# Altium schematic symbol library jlcpcb_2025_04_capacitors_extended_1206.schlib: 2503 symbols (part 8 of 14) (continued)
## CC1206MRX7R9BB473
designator C?  Capacitance: 47nF  (hidden comment: *)
Capacitor, Ceramic (MLCC), 47nF, ±20%, 50V, X7R, ±20%, SMD 1206; Manufacturer: YAGEO; Manufacturer Part Number: CC1206MRX7R9BB473; Package Size: 1206; JLCPCB Basic Part: No; JLCPCB Part Number: C2174358; Supplier 1: LCSC; Category: Capacitors - MLCC; Supplier Part Number 1: C2174358; Tolerance: ±20%; Voltage Rating: 50V; Temperature Coefficient: X7R; RoHS: Yes; ComponentLink1Description: Datasheet; ComponentLink1URL: https://wmsc.lcsc.com/wmsc/upload/file/pdf/v2/lcsc/2202040700_YAGEO-CC1206MRX7R9BB473_C2174358.pdf; ComponentLink2Description: JLCPCB Part URL; ComponentLink2URL: https://jlcpcb.com/partdetail/C2174358; ComponentLink3Description: LCSC Part URL; ComponentLink3URL: https://lcsc.com/product-detail/Multilayer-Ceramic-Capacitors-MLCC---SMD-SMT_YAGEO-YAGEO-CC1206MRX7R9BB473_C2174358.html
footprint CAP-1206 (1206 (3216M) Capacitor)
pins: 1, 2

## CC1206MRY5V6BB106
designator C?  Capacitance: 10uF  (hidden comment: *)
Capacitor, Ceramic (MLCC), 10uF, ±20%, 10V, Y5V, ±20%, SMD 1206; Manufacturer: YAGEO; Manufacturer Part Number: CC1206MRY5V6BB106; Package Size: 1206; JLCPCB Basic Part: No; JLCPCB Part Number: C527365; Supplier 1: LCSC; Category: Capacitors - MLCC; Supplier Part Number 1: C527365; Tolerance: ±20%; Voltage Rating: 10V; Temperature Coefficient: Y5V; RoHS: Yes; ComponentLink1Description: Datasheet; ComponentLink1URL: https://wmsc.lcsc.com/wmsc/upload/file/pdf/v2/lcsc/2006031537_YAGEO-CC1206MRY5V6BB106_C527365.pdf; ComponentLink2Description: JLCPCB Part URL; ComponentLink2URL: https://jlcpcb.com/partdetail/C527365; ComponentLink3Description: LCSC Part URL; ComponentLink3URL: https://lcsc.com/product-detail/Multilayer-Ceramic-Capacitors-MLCC---SMD-SMT_YAGEO-YAGEO-CC1206MRY5V6BB106_C527365.html
footprint CAP-1206 (1206 (3216M) Capacitor)
pins: 1, 2

## CC1206MRY5V7BB105
designator C?  Capacitance: 1uF  (hidden comment: *)
Capacitor, Ceramic (MLCC), 1uF, ±20%, 16V, Y5V, ±20%, SMD 1206; Manufacturer: YAGEO; Manufacturer Part Number: CC1206MRY5V7BB105; Package Size: 1206; JLCPCB Basic Part: No; JLCPCB Part Number: C527366; Supplier 1: LCSC; Category: Capacitors - MLCC; Supplier Part Number 1: C527366; Tolerance: ±20%; Voltage Rating: 16V; Temperature Coefficient: Y5V; RoHS: Yes; ComponentLink1Description: Datasheet; ComponentLink1URL: https://wmsc.lcsc.com/wmsc/upload/file/pdf/v2/lcsc/2006031836_YAGEO-CC1206MRY5V7BB105_C527366.pdf; ComponentLink2Description: JLCPCB Part URL; ComponentLink2URL: https://jlcpcb.com/partdetail/C527366; ComponentLink3Description: LCSC Part URL; ComponentLink3URL: https://lcsc.com/product-detail/Multilayer-Ceramic-Capacitors-MLCC---SMD-SMT_YAGEO-YAGEO-CC1206MRY5V7BB105_C527366.html
footprint CAP-1206 (1206 (3216M) Capacitor)
pins: 1, 2

## CC1206MRY5V7BB475
designator C?  Capacitance: 4.7uF  (hidden comment: *)
Capacitor, Ceramic (MLCC), 4.7uF, ±20%, 16V, Y5V, ±20%, SMD 1206; Manufacturer: YAGEO; Manufacturer Part Number: CC1206MRY5V7BB475; Package Size: 1206; JLCPCB Basic Part: No; JLCPCB Part Number: C577250; Supplier 1: LCSC; Category: Capacitors - MLCC; Supplier Part Number 1: C577250; Tolerance: ±20%; Voltage Rating: 16V; Temperature Coefficient: Y5V; RoHS: Yes; ComponentLink1Description: Datasheet; ComponentLink1URL: https://wmsc.lcsc.com/wmsc/upload/file/pdf/v2/lcsc/2006091815_YAGEO-CC1206MRY5V7BB475_C577250.pdf; ComponentLink2Description: JLCPCB Part URL; ComponentLink2URL: https://jlcpcb.com/partdetail/C577250; ComponentLink3Description: LCSC Part URL; ComponentLink3URL: https://lcsc.com/product-detail/Multilayer-Ceramic-Capacitors-MLCC---SMD-SMT_YAGEO-YAGEO-CC1206MRY5V7BB475_C577250.html
footprint CAP-1206 (1206 (3216M) Capacitor)
pins: 1, 2

## CC1206MRY5V8BB105
designator C?  Capacitance: 1uF  (hidden comment: *)
Capacitor, Ceramic (MLCC), 1uF, ±20%, 25V, Y5V, ±20%, SMD 1206; Manufacturer: YAGEO; Manufacturer Part Number: CC1206MRY5V8BB105; Package Size: 1206; JLCPCB Basic Part: No; JLCPCB Part Number: C541522; Supplier 1: LCSC; Category: Capacitors - MLCC; Supplier Part Number 1: C541522; Tolerance: ±20%; Voltage Rating: 25V; Temperature Coefficient: Y5V; RoHS: Yes; ComponentLink1Description: Datasheet; ComponentLink1URL: https://wmsc.lcsc.com/wmsc/upload/file/pdf/v2/lcsc/2006151143_YAGEO-CC1206MRY5V8BB105_C541522.pdf; ComponentLink2Description: JLCPCB Part URL; ComponentLink2URL: https://jlcpcb.com/partdetail/C541522; ComponentLink3Description: LCSC Part URL; ComponentLink3URL: https://lcsc.com/product-detail/Multilayer-Ceramic-Capacitors-MLCC---SMD-SMT_YAGEO-YAGEO-CC1206MRY5V8BB105_C541522.html
footprint CAP-1206 (1206 (3216M) Capacitor)
pins: 1, 2

## CC1206MRY5V9BB104
designator C?  Capacitance: 100nF  (hidden comment: *)
Capacitor, Ceramic (MLCC), 100nF, ±20%, 50V, Y5V, ±20%, SMD 1206; Manufacturer: YAGEO; Manufacturer Part Number: CC1206MRY5V9BB104; Package Size: 1206; JLCPCB Basic Part: No; JLCPCB Part Number: C2174667; Supplier 1: LCSC; Category: Capacitors - MLCC; Supplier Part Number 1: C2174667; Tolerance: ±20%; Voltage Rating: 50V; Temperature Coefficient: Y5V; RoHS: Yes; ComponentLink1Description: Datasheet; ComponentLink1URL: https://wmsc.lcsc.com/wmsc/upload/file/pdf/v2/lcsc/2202040700_YAGEO-CC1206MRY5V9BB104_C2174667.pdf; ComponentLink2Description: JLCPCB Part URL; ComponentLink2URL: https://jlcpcb.com/partdetail/C2174667; ComponentLink3Description: LCSC Part URL; ComponentLink3URL: https://lcsc.com/product-detail/Multilayer-Ceramic-Capacitors-MLCC---SMD-SMT_YAGEO-YAGEO-CC1206MRY5V9BB104_C2174667.html
footprint CAP-1206 (1206 (3216M) Capacitor)
pins: 1, 2

## CC1206MRY5V9BB105
designator C?  Capacitance: 1uF  (hidden comment: *)
Capacitor, Ceramic (MLCC), 1uF, ±20%, 50V, Y5V, ±20%, SMD 1206; Manufacturer: YAGEO; Manufacturer Part Number: CC1206MRY5V9BB105; Package Size: 1206; JLCPCB Basic Part: No; JLCPCB Part Number: C527367; Supplier 1: LCSC; Category: Capacitors - MLCC; Supplier Part Number 1: C527367; Tolerance: ±20%; Voltage Rating: 50V; Temperature Coefficient: Y5V; RoHS: Yes; ComponentLink1Description: Datasheet; ComponentLink1URL: https://wmsc.lcsc.com/wmsc/upload/file/pdf/v2/lcsc/2007221234_YAGEO-CC1206MRY5V9BB105_C527367.pdf; ComponentLink2Description: JLCPCB Part URL; ComponentLink2URL: https://jlcpcb.com/partdetail/C527367; ComponentLink3Description: LCSC Part URL; ComponentLink3URL: https://lcsc.com/product-detail/Multilayer-Ceramic-Capacitors-MLCC---SMD-SMT_YAGEO-YAGEO-CC1206MRY5V9BB105_C527367.html
footprint CAP-1206 (1206 (3216M) Capacitor)
pins: 1, 2

## CC1206ZKY5V5BB226
designator C?  Capacitance: 22uF  (hidden comment: *)
Capacitor, Ceramic (MLCC), 22uF, 6.3V, Y5V, SMD 1206; Manufacturer: YAGEO; Manufacturer Part Number: CC1206ZKY5V5BB226; Temperature Rating: -20%~+80%; Package Size: 1206; JLCPCB Basic Part: No; JLCPCB Part Number: C527368; Supplier 1: LCSC; Category: Capacitors - MLCC; Supplier Part Number 1: C527368; Voltage Rating: 6.3V; Temperature Coefficient: Y5V; RoHS: Yes; ComponentLink1Description: Datasheet; ComponentLink1URL: https://wmsc.lcsc.com/wmsc/upload/file/pdf/v2/lcsc/2006241835_YAGEO-CC1206ZKY5V5BB226_C527368.pdf; ComponentLink2Description: JLCPCB Part URL; ComponentLink2URL: https://jlcpcb.com/partdetail/C527368; ComponentLink3Description: LCSC Part URL; ComponentLink3URL: https://lcsc.com/product-detail/Multilayer-Ceramic-Capacitors-MLCC---SMD-SMT_YAGEO-YAGEO-CC1206ZKY5V5BB226_C527368.html
footprint CAP-1206 (1206 (3216M) Capacitor)
pins: 1, 2

## CC1206ZKY5V7BB106
designator C?  Capacitance: 10uF  (hidden comment: *)
Capacitor, Ceramic (MLCC), 10uF, 16V, Y5V, SMD 1206; Manufacturer: YAGEO; Manufacturer Part Number: CC1206ZKY5V7BB106; Temperature Rating: -20%~+80%; Package Size: 1206; JLCPCB Basic Part: No; JLCPCB Part Number: C106237; Supplier 1: LCSC; Category: Capacitors - MLCC; Supplier Part Number 1: C106237; Voltage Rating: 16V; Temperature Coefficient: Y5V; RoHS: Yes; ComponentLink1Description: Datasheet; ComponentLink1URL: https://wmsc.lcsc.com/wmsc/upload/file/pdf/v2/lcsc/2304140030_YAGEO-CC1206ZKY5V7BB106_C106237.pdf; ComponentLink2Description: JLCPCB Part URL; ComponentLink2URL: https://jlcpcb.com/partdetail/C106237; ComponentLink3Description: LCSC Part URL; ComponentLink3URL: https://lcsc.com/product-detail/Multilayer-Ceramic-Capacitors-MLCC---SMD-SMT_YAGEO-YAGEO-CC1206ZKY5V7BB106_C106237.html
footprint CAP-1206 (1206 (3216M) Capacitor)
pins: 1, 2

## CC1206ZKY5V7BB226
designator C?  Capacitance: 22uF  (hidden comment: *)
Capacitor, Ceramic (MLCC), 22uF, 16V, Y5V, SMD 1206; Manufacturer: YAGEO; Manufacturer Part Number: CC1206ZKY5V7BB226; Temperature Rating: -20%~+80%; Package Size: 1206; JLCPCB Basic Part: No; JLCPCB Part Number: C527370; Supplier 1: LCSC; Category: Capacitors - MLCC; Supplier Part Number 1: C527370; Voltage Rating: 16V; Temperature Coefficient: Y5V; RoHS: Yes; ComponentLink1Description: Datasheet; ComponentLink1URL: https://wmsc.lcsc.com/wmsc/upload/file/pdf/v2/lcsc/2006101836_YAGEO-CC1206ZKY5V7BB226_C527370.pdf; ComponentLink2Description: JLCPCB Part URL; ComponentLink2URL: https://jlcpcb.com/partdetail/C527370; ComponentLink3Description: LCSC Part URL; ComponentLink3URL: https://lcsc.com/product-detail/Multilayer-Ceramic-Capacitors-MLCC---SMD-SMT_YAGEO-YAGEO-CC1206ZKY5V7BB226_C527370.html
footprint CAP-1206 (1206 (3216M) Capacitor)
pins: 1, 2

## CC1206ZKY5V8BB106
designator C?  Capacitance: 10uF  (hidden comment: *)
Capacitor, Ceramic (MLCC), 10uF, 25V, Y5V, SMD 1206; Manufacturer: YAGEO; Manufacturer Part Number: CC1206ZKY5V8BB106; Temperature Rating: -20%~+80%; Package Size: 1206; JLCPCB Basic Part: No; JLCPCB Part Number: C106238; Supplier 1: LCSC; Category: Capacitors - MLCC; Supplier Part Number 1: C106238; Voltage Rating: 25V; Temperature Coefficient: Y5V; RoHS: Yes; ComponentLink1Description: Datasheet; ComponentLink1URL: https://wmsc.lcsc.com/wmsc/upload/file/pdf/v2/lcsc/2304140030_YAGEO-CC1206ZKY5V8BB106_C106238.pdf; ComponentLink2Description: JLCPCB Part URL; ComponentLink2URL: https://jlcpcb.com/partdetail/C106238; ComponentLink3Description: LCSC Part URL; ComponentLink3URL: https://lcsc.com/product-detail/Multilayer-Ceramic-Capacitors-MLCC---SMD-SMT_YAGEO-YAGEO-CC1206ZKY5V8BB106_C106238.html
footprint CAP-1206 (1206 (3216M) Capacitor)
pins: 1, 2

## CC1206ZKY5V9BB225
designator C?  Capacitance: 2.2uF  (hidden comment: *)
Capacitor, Ceramic (MLCC), 2.2uF, 50V, Y5V, SMD 1206; Manufacturer: YAGEO; Manufacturer Part Number: CC1206ZKY5V9BB225; Temperature Rating: -20%~+80%; Package Size: 1206; JLCPCB Basic Part: No; JLCPCB Part Number: C577253; Supplier 1: LCSC; Category: Capacitors - MLCC; Supplier Part Number 1: C577253; Voltage Rating: 50V; Temperature Coefficient: Y5V; RoHS: Yes; ComponentLink1Description: Datasheet; ComponentLink1URL: https://wmsc.lcsc.com/wmsc/upload/file/pdf/v2/lcsc/2112221830_YAGEO-CC1206ZKY5V9BB225_C577253.pdf; ComponentLink2Description: JLCPCB Part URL; ComponentLink2URL: https://jlcpcb.com/partdetail/C577253; ComponentLink3Description: LCSC Part URL; ComponentLink3URL: https://lcsc.com/product-detail/Multilayer-Ceramic-Capacitors-MLCC---SMD-SMT_YAGEO-YAGEO-CC1206ZKY5V9BB225_C577253.html
footprint CAP-1206 (1206 (3216M) Capacitor)
pins: 1, 2

## CC1206ZRY5V6BB106
designator C?  Capacitance: 10uF  (hidden comment: *)
Capacitor, Ceramic (MLCC), 10uF, 10V, Y5V, SMD 1206; Manufacturer: YAGEO; Manufacturer Part Number: CC1206ZRY5V6BB106; Temperature Rating: -20%~+80%; Package Size: 1206; JLCPCB Basic Part: No; JLCPCB Part Number: C113914; Supplier 1: LCSC; Category: Capacitors - MLCC; Supplier Part Number 1: C113914; Voltage Rating: 10V; Temperature Coefficient: Y5V; RoHS: Yes; ComponentLink1Description: Datasheet; ComponentLink1URL: https://wmsc.lcsc.com/wmsc/upload/file/pdf/v2/lcsc/2304140030_YAGEO-CC1206ZRY5V6BB106_C113914.pdf; ComponentLink2Description: JLCPCB Part URL; ComponentLink2URL: https://jlcpcb.com/partdetail/C113914; ComponentLink3Description: LCSC Part URL; ComponentLink3URL: https://lcsc.com/product-detail/Multilayer-Ceramic-Capacitors-MLCC---SMD-SMT_YAGEO-YAGEO-CC1206ZRY5V6BB106_C113914.html
footprint CAP-1206 (1206 (3216M) Capacitor)
pins: 1, 2

## CC1206ZRY5V7BB105
designator C?  Capacitance: 1uF  (hidden comment: *)
Capacitor, Ceramic (MLCC), 1uF, 16V, Y5V, SMD 1206; Manufacturer: YAGEO; Manufacturer Part Number: CC1206ZRY5V7BB105; Temperature Rating: -20%~+80%; Package Size: 1206; JLCPCB Basic Part: No; JLCPCB Part Number: C527371; Supplier 1: LCSC; Category: Capacitors - MLCC; Supplier Part Number 1: C527371; Voltage Rating: 16V; Temperature Coefficient: Y5V; RoHS: Yes; ComponentLink1Description: Datasheet; ComponentLink1URL: https://wmsc.lcsc.com/wmsc/upload/file/pdf/v2/lcsc/2005261833_YAGEO-CC1206ZRY5V7BB105_C527371.pdf; ComponentLink2Description: JLCPCB Part URL; ComponentLink2URL: https://jlcpcb.com/partdetail/C527371; ComponentLink3Description: LCSC Part URL; ComponentLink3URL: https://lcsc.com/product-detail/Multilayer-Ceramic-Capacitors-MLCC---SMD-SMT_YAGEO-YAGEO-CC1206ZRY5V7BB105_C527371.html
footprint CAP-1206 (1206 (3216M) Capacitor)
pins: 1, 2

## CC1206ZRY5V7BB225
designator C?  Capacitance: 2.2uF  (hidden comment: *)
Capacitor, Ceramic (MLCC), 2.2uF, 16V, Y5V, SMD 1206; Manufacturer: YAGEO; Manufacturer Part Number: CC1206ZRY5V7BB225; Temperature Rating: -20%~+80%; Package Size: 1206; JLCPCB Basic Part: No; JLCPCB Part Number: C309504; Supplier 1: LCSC; Category: Capacitors - MLCC; Supplier Part Number 1: C309504; Voltage Rating: 16V; Temperature Coefficient: Y5V; RoHS: Yes; ComponentLink1Description: Datasheet; ComponentLink1URL: https://wmsc.lcsc.com/wmsc/upload/file/pdf/v2/lcsc/2311211121_YAGEO-CC1206ZRY5V7BB225_C309504.pdf; ComponentLink2Description: JLCPCB Part URL; ComponentLink2URL: https://jlcpcb.com/partdetail/C309504; ComponentLink3Description: LCSC Part URL; ComponentLink3URL: https://lcsc.com/product-detail/Multilayer-Ceramic-Capacitors-MLCC---SMD-SMT_YAGEO-YAGEO-CC1206ZRY5V7BB225_C309504.html
footprint CAP-1206 (1206 (3216M) Capacitor)
pins: 1, 2

## CC1206ZRY5V8BB105
designator C?  Capacitance: 1uF  (hidden comment: *)
Capacitor, Ceramic (MLCC), 1uF, 25V, Y5V, SMD 1206; Manufacturer: YAGEO; Manufacturer Part Number: CC1206ZRY5V8BB105; Temperature Rating: -20%~+80%; Package Size: 1206; JLCPCB Basic Part: No; JLCPCB Part Number: C527372; Supplier 1: LCSC; Category: Capacitors - MLCC; Supplier Part Number 1: C527372; Voltage Rating: 25V; Temperature Coefficient: Y5V; RoHS: Yes; ComponentLink1Description: Datasheet; ComponentLink1URL: https://wmsc.lcsc.com/wmsc/upload/file/pdf/v2/lcsc/2006101836_YAGEO-CC1206ZRY5V8BB105_C527372.pdf; ComponentLink2Description: JLCPCB Part URL; ComponentLink2URL: https://jlcpcb.com/partdetail/C527372; ComponentLink3Description: LCSC Part URL; ComponentLink3URL: https://lcsc.com/product-detail/Multilayer-Ceramic-Capacitors-MLCC---SMD-SMT_YAGEO-YAGEO-CC1206ZRY5V8BB105_C527372.html
footprint CAP-1206 (1206 (3216M) Capacitor)
pins: 1, 2

## CC1206ZRY5V8BB225
designator C?  Capacitance: 2.2uF  (hidden comment: *)
Capacitor, Ceramic (MLCC), 2.2uF, 25V, Y5V, SMD 1206; Manufacturer: YAGEO; Manufacturer Part Number: CC1206ZRY5V8BB225; Temperature Rating: -20%~+80%; Package Size: 1206; JLCPCB Basic Part: No; JLCPCB Part Number: C527373; Supplier 1: LCSC; Category: Capacitors - MLCC; Supplier Part Number 1: C527373; Voltage Rating: 25V; Temperature Coefficient: Y5V; RoHS: Yes; ComponentLink1Description: Datasheet; ComponentLink1URL: https://wmsc.lcsc.com/wmsc/upload/file/pdf/v2/lcsc/2009071505_YAGEO-CC1206ZRY5V8BB225_C527373.pdf; ComponentLink2Description: JLCPCB Part URL; ComponentLink2URL: https://jlcpcb.com/partdetail/C527373; ComponentLink3Description: LCSC Part URL; ComponentLink3URL: https://lcsc.com/product-detail/Multilayer-Ceramic-Capacitors-MLCC---SMD-SMT_YAGEO-YAGEO-CC1206ZRY5V8BB225_C527373.html
footprint CAP-1206 (1206 (3216M) Capacitor)
pins: 1, 2

## CC1206ZRY5V8BB474
designator C?  Capacitance: 470nF  (hidden comment: *)
Capacitor, Ceramic (MLCC), 470nF, 25V, Y5V, SMD 1206; Manufacturer: YAGEO; Manufacturer Part Number: CC1206ZRY5V8BB474; Temperature Rating: -20%~+80%; Package Size: 1206; JLCPCB Basic Part: No; JLCPCB Part Number: C577257; Supplier 1: LCSC; Category: Capacitors - MLCC; Supplier Part Number 1: C577257; Voltage Rating: 25V; Temperature Coefficient: Y5V; RoHS: Yes; ComponentLink1Description: Datasheet; ComponentLink1URL: https://wmsc.lcsc.com/wmsc/upload/file/pdf/v2/lcsc/2009282204_YAGEO-CC1206ZRY5V8BB474_C577257.pdf; ComponentLink2Description: JLCPCB Part URL; ComponentLink2URL: https://jlcpcb.com/partdetail/C577257; ComponentLink3Description: LCSC Part URL; ComponentLink3URL: https://lcsc.com/product-detail/Multilayer-Ceramic-Capacitors-MLCC---SMD-SMT_YAGEO-YAGEO-CC1206ZRY5V8BB474_C577257.html
footprint CAP-1206 (1206 (3216M) Capacitor)
pins: 1, 2

## CC1206ZRY5V9BB104
designator C?  Capacitance: 100nF  (hidden comment: *)
Capacitor, Ceramic (MLCC), 100nF, 50V, Y5V, SMD 1206; Manufacturer: YAGEO; Manufacturer Part Number: CC1206ZRY5V9BB104; Temperature Rating: -20%~+80%; Package Size: 1206; JLCPCB Basic Part: No; JLCPCB Part Number: C577258; Supplier 1: LCSC; Category: Capacitors - MLCC; Supplier Part Number 1: C577258; Voltage Rating: 50V; Temperature Coefficient: Y5V; RoHS: Yes; ComponentLink1Description: Datasheet; ComponentLink1URL: https://wmsc.lcsc.com/wmsc/upload/file/pdf/v2/lcsc/2006111833_YAGEO-CC1206ZRY5V9BB104_C577258.pdf; ComponentLink2Description: JLCPCB Part URL; ComponentLink2URL: https://jlcpcb.com/partdetail/C577258; ComponentLink3Description: LCSC Part URL; ComponentLink3URL: https://lcsc.com/product-detail/Multilayer-Ceramic-Capacitors-MLCC---SMD-SMT_YAGEO-YAGEO-CC1206ZRY5V9BB104_C577258.html
footprint CAP-1206 (1206 (3216M) Capacitor)
pins: 1, 2

## CC1206ZRY5V9BB105
designator C?  Capacitance: 1uF  (hidden comment: *)
Capacitor, Ceramic (MLCC), 1uF, 50V, Y5V, SMD 1206; Manufacturer: YAGEO; Manufacturer Part Number: CC1206ZRY5V9BB105; Temperature Rating: -20%~+80%; Package Size: 1206; JLCPCB Basic Part: No; JLCPCB Part Number: C326607; Supplier 1: LCSC; Category: Capacitors - MLCC; Supplier Part Number 1: C326607; Voltage Rating: 50V; Temperature Coefficient: Y5V; RoHS: Yes; ComponentLink1Description: Datasheet; ComponentLink1URL: https://wmsc.lcsc.com/wmsc/upload/file/pdf/v2/lcsc/1811061214_YAGEO-CC1206ZRY5V9BB105_C326607.pdf; ComponentLink2Description: JLCPCB Part URL; ComponentLink2URL: https://jlcpcb.com/partdetail/C326607; ComponentLink3Description: LCSC Part URL; ComponentLink3URL: https://lcsc.com/product-detail/Multilayer-Ceramic-Capacitors-MLCC---SMD-SMT_YAGEO-YAGEO-CC1206ZRY5V9BB105_C326607.html
footprint CAP-1206 (1206 (3216M) Capacitor)
pins: 1, 2

## CC1206ZRY5V9BB224
designator C?  Capacitance: 220nF  (hidden comment: *)
Capacitor, Ceramic (MLCC), 220nF, 50V, Y5V, SMD 1206; Manufacturer: YAGEO; Manufacturer Part Number: CC1206ZRY5V9BB224; Temperature Rating: -20%~+80%; Package Size: 1206; JLCPCB Basic Part: No; JLCPCB Part Number: C113916; Supplier 1: LCSC; Category: Capacitors - MLCC; Supplier Part Number 1: C113916; Voltage Rating: 50V; Temperature Coefficient: Y5V; RoHS: Yes; ComponentLink1Description: Datasheet; ComponentLink1URL: https://wmsc.lcsc.com/wmsc/upload/file/pdf/v2/lcsc/2304140030_YAGEO-CC1206ZRY5V9BB224_C113916.pdf; ComponentLink2Description: JLCPCB Part URL; ComponentLink2URL: https://jlcpcb.com/partdetail/C113916; ComponentLink3Description: LCSC Part URL; ComponentLink3URL: https://lcsc.com/product-detail/Multilayer-Ceramic-Capacitors-MLCC---SMD-SMT_YAGEO-YAGEO-CC1206ZRY5V9BB224_C113916.html
footprint CAP-1206 (1206 (3216M) Capacitor)
pins: 1, 2

## CC1206ZRY5V9BB474
designator C?  Capacitance: 470nF  (hidden comment: *)
Capacitor, Ceramic (MLCC), 470nF, 50V, Y5V, SMD 1206; Manufacturer: YAGEO; Manufacturer Part Number: CC1206ZRY5V9BB474; Temperature Rating: -20%~+80%; Package Size: 1206; JLCPCB Basic Part: No; JLCPCB Part Number: C113917; Supplier 1: LCSC; Category: Capacitors - MLCC; Supplier Part Number 1: C113917; Voltage Rating: 50V; Temperature Coefficient: Y5V; RoHS: Yes; ComponentLink1Description: Datasheet; ComponentLink1URL: https://wmsc.lcsc.com/wmsc/upload/file/pdf/v2/lcsc/2304140030_YAGEO-CC1206ZRY5V9BB474_C113917.pdf; ComponentLink2Description: JLCPCB Part URL; ComponentLink2URL: https://jlcpcb.com/partdetail/C113917; ComponentLink3Description: LCSC Part URL; ComponentLink3URL: https://lcsc.com/product-detail/Multilayer-Ceramic-Capacitors-MLCC---SMD-SMT_YAGEO-YAGEO-CC1206ZRY5V9BB474_C113917.html
footprint CAP-1206 (1206 (3216M) Capacitor)
pins: 1, 2

## CGA5C2C0G1H223JT0Y0N
designator C?  Capacitance: 22nF  (hidden comment: *)
Capacitor, Ceramic (MLCC), 22nF, ±5%, 50V, C0G, ±5%, SMD 1206; Manufacturer: TDK; Manufacturer Part Number: CGA5C2C0G1H223JT0Y0N; Package Size: 1206; JLCPCB Basic Part: No; JLCPCB Part Number: C361178; Supplier 1: LCSC; Category: Capacitors - MLCC; Supplier Part Number 1: C361178; Tolerance: ±5%; Voltage Rating: 50V; Temperature Coefficient: C0G; RoHS: Yes; ComponentLink1Description: Datasheet; ComponentLink1URL: https://wmsc.lcsc.com/wmsc/upload/file/pdf/v2/lcsc/2304140030_TDK-CGA5C2C0G1H223JT0Y0N_C361178.pdf; ComponentLink2Description: JLCPCB Part URL; ComponentLink2URL: https://jlcpcb.com/partdetail/C361178; ComponentLink3Description: LCSC Part URL; ComponentLink3URL: https://lcsc.com/product-detail/Multilayer-Ceramic-Capacitors-MLCC---SMD-SMT_TDK-TDK-CGA5C2C0G1H223JT0Y0N_C361178.html
footprint CAP-1206 (1206 (3216M) Capacitor)
pins: 1, 2

## CGA5C4C0G2J101JT0Y0N
designator C?  Capacitance: 100pF  (hidden comment: *)
Capacitor, Ceramic (MLCC), 100pF, ±5%, 630V, null, ±5%, SMD 1206; Manufacturer: TDK; Manufacturer Part Number: CGA5C4C0G2J101JT0Y0N; Package Size: 1206; JLCPCB Basic Part: No; JLCPCB Part Number: C342837; Supplier 1: LCSC; Category: Capacitors - MLCC; Supplier Part Number 1: C342837; Tolerance: ±5%; Voltage Rating: 630V; Temperature Coefficient: null; RoHS: Yes; ComponentLink1Description: Datasheet; ComponentLink1URL: https://wmsc.lcsc.com/wmsc/upload/file/pdf/v2/lcsc/2211030930_TDK-CGA5C4C0G2J101JT0Y0N_C342837.pdf; ComponentLink2Description: JLCPCB Part URL; ComponentLink2URL: https://jlcpcb.com/partdetail/C342837; ComponentLink3Description: LCSC Part URL; ComponentLink3URL: https://lcsc.com/product-detail/Multilayer-Ceramic-Capacitors-MLCC---SMD-SMT_TDK-TDK-CGA5C4C0G2J101JT0Y0N_C342837.html
footprint CAP-1206 (1206 (3216M) Capacitor)
pins: 1, 2

## CGA5F4C0G2J102JT0Y0N
designator C?  Capacitance: 1nF  (hidden comment: *)
Capacitor, Ceramic (MLCC), 1nF, ±5%, 630V, C0G, ±5%, SMD 1206; Manufacturer: TDK; Manufacturer Part Number: CGA5F4C0G2J102JT0Y0N; Package Size: 1206; JLCPCB Basic Part: No; JLCPCB Part Number: C342841; Supplier 1: LCSC; Category: Capacitors - MLCC; Supplier Part Number 1: C342841; Tolerance: ±5%; Voltage Rating: 630V; Temperature Coefficient: C0G; RoHS: Yes; ComponentLink1Description: Datasheet; ComponentLink1URL: https://wmsc.lcsc.com/wmsc/upload/file/pdf/v2/lcsc/2208230930_TDK-CGA5F4C0G2J102JT0Y0N_C342841.pdf; ComponentLink2Description: JLCPCB Part URL; ComponentLink2URL: https://jlcpcb.com/partdetail/C342841; ComponentLink3Description: LCSC Part URL; ComponentLink3URL: https://lcsc.com/product-detail/Multilayer-Ceramic-Capacitors-MLCC---SMD-SMT_TDK-TDK-CGA5F4C0G2J102JT0Y0N_C342841.html
footprint CAP-1206 (1206 (3216M) Capacitor)
pins: 1, 2

## CGA5F4C0G2J472JT0Y0N
designator C?  Capacitance: 4.7nF  (hidden comment: *)
Capacitor, Ceramic (MLCC), 4.7nF, ±5%, 630V, C0G, ±5%, SMD 1206; Manufacturer: TDK; Manufacturer Part Number: CGA5F4C0G2J472JT0Y0N; Package Size: 1206; JLCPCB Basic Part: No; JLCPCB Part Number: C361181; Supplier 1: LCSC; Category: Capacitors - MLCC; Supplier Part Number 1: C361181; Tolerance: ±5%; Voltage Rating: 630V; Temperature Coefficient: C0G; RoHS: Yes; ComponentLink1Description: Datasheet; ComponentLink1URL: https://wmsc.lcsc.com/wmsc/upload/file/pdf/v2/lcsc/2209071200_TDK-CGA5F4C0G2J472JT0Y0N_C361181.pdf; ComponentLink2Description: JLCPCB Part URL; ComponentLink2URL: https://jlcpcb.com/partdetail/C361181; ComponentLink3Description: LCSC Part URL; ComponentLink3URL: https://lcsc.com/product-detail/Multilayer-Ceramic-Capacitors-MLCC---SMD-SMT_TDK-TDK-CGA5F4C0G2J472JT0Y0N_C361181.html
footprint CAP-1206 (1206 (3216M) Capacitor)
pins: 1, 2

## CGA5H2C0G2A103JT0Y0N
designator C?  Capacitance: 10nF  (hidden comment: *)
Capacitor, Ceramic (MLCC), 10nF, ±5%, 100V, C0G, ±5%, SMD 1206; Manufacturer: TDK; Manufacturer Part Number: CGA5H2C0G2A103JT0Y0N; Package Size: 1206; JLCPCB Basic Part: No; JLCPCB Part Number: C342719; Supplier 1: LCSC; Category: Capacitors - MLCC; Supplier Part Number 1: C342719; Tolerance: ±5%; Voltage Rating: 100V; Temperature Coefficient: C0G; RoHS: Yes; ComponentLink1Description: Datasheet; ComponentLink1URL: https://wmsc.lcsc.com/wmsc/upload/file/pdf/v2/lcsc/2304140030_TDK-CGA5H2C0G2A103JT0Y0N_C342719.pdf; ComponentLink2Description: JLCPCB Part URL; ComponentLink2URL: https://jlcpcb.com/partdetail/C342719; ComponentLink3Description: LCSC Part URL; ComponentLink3URL: https://lcsc.com/product-detail/Multilayer-Ceramic-Capacitors-MLCC---SMD-SMT_TDK-TDK-CGA5H2C0G2A103JT0Y0N_C342719.html
footprint CAP-1206 (1206 (3216M) Capacitor)
pins: 1, 2

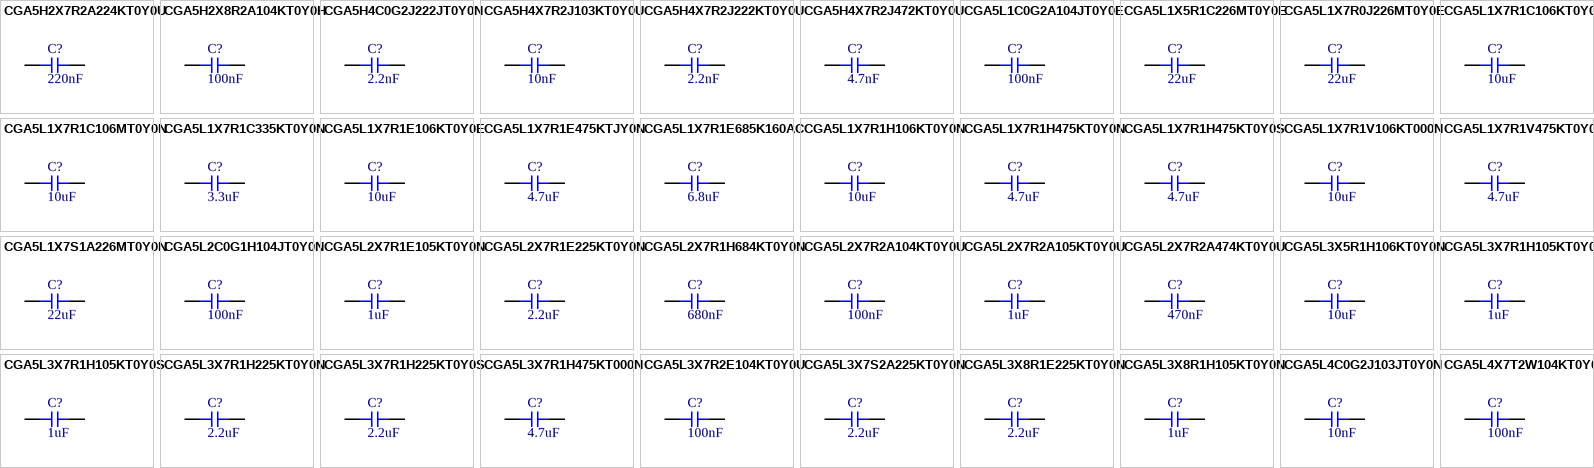
[diagram p35: symbols CGA5H2X7R2A224KT0Y0U to CGA5L4X7T2W104KT0Y0N]

## CGA5H2X7R2A224KT0Y0U
designator C?  Capacitance: 220nF  (hidden comment: *)
Capacitor, Ceramic (MLCC), 220nF, ±10%, 100V, ±10%, SMD 1206; Manufacturer: TDK; Manufacturer Part Number: CGA5H2X7R2A224KT0Y0U; Package Size: 1206; JLCPCB Basic Part: No; JLCPCB Part Number: C342823; Supplier 1: LCSC; Category: Capacitors - MLCC; Supplier Part Number 1: C342823; Tolerance: ±10%; Voltage Rating: 100V; RoHS: Yes; ComponentLink1Description: Datasheet; ComponentLink1URL: https://wmsc.lcsc.com/wmsc/upload/file/pdf/v2/lcsc/2107272240_TDK-CGA5H2X7R2A224KT0Y0U_C342823.pdf; ComponentLink2Description: JLCPCB Part URL; ComponentLink2URL: https://jlcpcb.com/partdetail/C342823; ComponentLink3Description: LCSC Part URL; ComponentLink3URL: https://lcsc.com/product-detail/Multilayer-Ceramic-Capacitors-MLCC---SMD-SMT_TDK-TDK-CGA5H2X7R2A224KT0Y0U_C342823.html
footprint CAP-1206 (1206 (3216M) Capacitor)
pins: 1, 2

## CGA5H2X8R2A104KT0Y0H
designator C?  Capacitance: 100nF  (hidden comment: *)
Capacitor, Ceramic (MLCC), 100nF, ±10%, 100V, X8R, ±10%, SMD 1206; Manufacturer: TDK; Manufacturer Part Number: CGA5H2X8R2A104KT0Y0H; Package Size: 1206; JLCPCB Basic Part: No; JLCPCB Part Number: C694514; Supplier 1: LCSC; Category: Capacitors - MLCC; Supplier Part Number 1: C694514; Tolerance: ±10%; Voltage Rating: 100V; Temperature Coefficient: X8R; RoHS: Yes; ComponentLink1Description: Datasheet; ComponentLink1URL: https://wmsc.lcsc.com/wmsc/upload/file/pdf/v2/lcsc/2304140030_TDK-CGA5H2X8R2A104KT0Y0H_C694514.pdf; ComponentLink2Description: JLCPCB Part URL; ComponentLink2URL: https://jlcpcb.com/partdetail/C694514; ComponentLink3Description: LCSC Part URL; ComponentLink3URL: https://lcsc.com/product-detail/Multilayer-Ceramic-Capacitors-MLCC---SMD-SMT_TDK-TDK-CGA5H2X8R2A104KT0Y0H_C694514.html
footprint CAP-1206 (1206 (3216M) Capacitor)
pins: 1, 2

## CGA5H4C0G2J222JT0Y0N
designator C?  Capacitance: 2.2nF  (hidden comment: *)
Capacitor, Ceramic (MLCC), 2.2nF, 630V, C0G, SMD 1206; Manufacturer: TDK; Manufacturer Part Number: CGA5H4C0G2J222JT0Y0N; Package Size: 1206; JLCPCB Basic Part: No; JLCPCB Part Number: C2896596; Supplier 1: LCSC; Category: Capacitors - MLCC; Supplier Part Number 1: C2896596; Voltage Rating: 630V; Temperature Coefficient: C0G; RoHS: Yes; ComponentLink1Description: Datasheet; ComponentLink1URL: https://wmsc.lcsc.com/wmsc/upload/file/pdf/v2/lcsc/2109151030_TDK-CGA5H4C0G2J222JT0Y0N_C2896596.pdf; ComponentLink2Description: JLCPCB Part URL; ComponentLink2URL: https://jlcpcb.com/partdetail/C2896596; ComponentLink3Description: LCSC Part URL; ComponentLink3URL: https://lcsc.com/product-detail/Multilayer-Ceramic-Capacitors-MLCC---SMD-SMT_TDK-TDK-CGA5H4C0G2J222JT0Y0N_C2896596.html
footprint CAP-1206 (1206 (3216M) Capacitor)
pins: 1, 2

## CGA5H4X7R2J103KT0Y0U
designator C?  Capacitance: 10nF  (hidden comment: *)
Capacitor, Ceramic (MLCC), 10nF, ±10%, 630V, X7R, ±10%, SMD 1206; Manufacturer: TDK; Manufacturer Part Number: CGA5H4X7R2J103KT0Y0U; Package Size: 1206; JLCPCB Basic Part: No; JLCPCB Part Number: C342834; Supplier 1: LCSC; Category: Capacitors - MLCC; Supplier Part Number 1: C342834; Tolerance: ±10%; Voltage Rating: 630V; Temperature Coefficient: X7R; RoHS: Yes; ComponentLink1Description: Datasheet; ComponentLink1URL: https://wmsc.lcsc.com/wmsc/upload/file/pdf/v2/lcsc/2304140030_TDK-CGA5H4X7R2J103KT0Y0U_C342834.pdf; ComponentLink2Description: JLCPCB Part URL; ComponentLink2URL: https://jlcpcb.com/partdetail/C342834; ComponentLink3Description: LCSC Part URL; ComponentLink3URL: https://lcsc.com/product-detail/Multilayer-Ceramic-Capacitors-MLCC---SMD-SMT_TDK-TDK-CGA5H4X7R2J103KT0Y0U_C342834.html
footprint CAP-1206 (1206 (3216M) Capacitor)
pins: 1, 2

## CGA5H4X7R2J222KT0Y0U
designator C?  Capacitance: 2.2nF  (hidden comment: *)
Capacitor, Ceramic (MLCC), 2.2nF, ±10%, X7R, ±10%, SMD 1206; Manufacturer: TDK; Manufacturer Part Number: CGA5H4X7R2J222KT0Y0U; Package Size: 1206; JLCPCB Basic Part: No; JLCPCB Part Number: C2939048; Supplier 1: LCSC; Category: Capacitors - MLCC; Supplier Part Number 1: C2939048; Tolerance: ±10%; Temperature Coefficient: X7R; RoHS: Yes; ComponentLink1Description: Datasheet; ComponentLink1URL: https://wmsc.lcsc.com/wmsc/upload/file/pdf/v2/lcsc/2201121830_TDK-CGA5H4X7R2J222KT0Y0U_C2939048.pdf; ComponentLink2Description: JLCPCB Part URL; ComponentLink2URL: https://jlcpcb.com/partdetail/C2939048; ComponentLink3Description: LCSC Part URL; ComponentLink3URL: https://lcsc.com/product-detail/Multilayer-Ceramic-Capacitors-MLCC---SMD-SMT_TDK-TDK-CGA5H4X7R2J222KT0Y0U_C2939048.html
footprint CAP-1206 (1206 (3216M) Capacitor)
pins: 1, 2

## CGA5H4X7R2J472KT0Y0U
designator C?  Capacitance: 4.7nF  (hidden comment: *)
Capacitor, Ceramic (MLCC), 4.7nF, ±10%, 630V, X7R, ±10%, SMD 1206; Manufacturer: TDK; Manufacturer Part Number: CGA5H4X7R2J472KT0Y0U; Package Size: 1206; JLCPCB Basic Part: No; JLCPCB Part Number: C432947; Supplier 1: LCSC; Category: Capacitors - MLCC; Supplier Part Number 1: C432947; Tolerance: ±10%; Voltage Rating: 630V; Temperature Coefficient: X7R; RoHS: Yes; ComponentLink1Description: Datasheet; ComponentLink1URL: https://wmsc.lcsc.com/wmsc/upload/file/pdf/v2/lcsc/2304140030_TDK-CGA5H4X7R2J472KT0Y0U_C432947.pdf; ComponentLink2Description: JLCPCB Part URL; ComponentLink2URL: https://jlcpcb.com/partdetail/C432947; ComponentLink3Description: LCSC Part URL; ComponentLink3URL: https://lcsc.com/product-detail/Multilayer-Ceramic-Capacitors-MLCC---SMD-SMT_TDK-TDK-CGA5H4X7R2J472KT0Y0U_C432947.html
footprint CAP-1206 (1206 (3216M) Capacitor)
pins: 1, 2

## CGA5L1C0G2A104JT0Y0E
designator C?  Capacitance: 100nF  (hidden comment: *)
Capacitor, Ceramic (MLCC), 100nF, ±5%, 100V, C0G, ±5%, SMD 1206; Manufacturer: TDK; Manufacturer Part Number: CGA5L1C0G2A104JT0Y0E; Package Size: 1206; JLCPCB Basic Part: No; JLCPCB Part Number: C531430; Supplier 1: LCSC; Category: Capacitors - MLCC; Supplier Part Number 1: C531430; Tolerance: ±5%; Voltage Rating: 100V; Temperature Coefficient: C0G; RoHS: Yes; ComponentLink1Description: Datasheet; ComponentLink1URL: https://wmsc.lcsc.com/wmsc/upload/file/pdf/v2/lcsc/2304140030_TDK-CGA5L1C0G2A104JT0Y0E_C531430.pdf; ComponentLink2Description: JLCPCB Part URL; ComponentLink2URL: https://jlcpcb.com/partdetail/C531430; ComponentLink3Description: LCSC Part URL; ComponentLink3URL: https://lcsc.com/product-detail/Multilayer-Ceramic-Capacitors-MLCC---SMD-SMT_TDK-TDK-CGA5L1C0G2A104JT0Y0E_C531430.html
footprint CAP-1206 (1206 (3216M) Capacitor)
pins: 1, 2

## CGA5L1X5R1C226MT0Y0E
designator C?  Capacitance: 22uF  (hidden comment: *)
Capacitor, Ceramic (MLCC), 22uF, ±20%, 16V, X5R, ±20%, SMD 1206; Manufacturer: TDK; Manufacturer Part Number: CGA5L1X5R1C226MT0Y0E; Package Size: 1206; JLCPCB Basic Part: No; JLCPCB Part Number: C329953; Supplier 1: LCSC; Category: Capacitors - MLCC; Supplier Part Number 1: C329953; Tolerance: ±20%; Voltage Rating: 16V; Temperature Coefficient: X5R; RoHS: Yes; ComponentLink1Description: Datasheet; ComponentLink1URL: https://wmsc.lcsc.com/wmsc/upload/file/pdf/v2/lcsc/2304140030_TDK-CGA5L1X5R1C226MT0Y0E_C329953.pdf; ComponentLink2Description: JLCPCB Part URL; ComponentLink2URL: https://jlcpcb.com/partdetail/C329953; ComponentLink3Description: LCSC Part URL; ComponentLink3URL: https://lcsc.com/product-detail/Multilayer-Ceramic-Capacitors-MLCC---SMD-SMT_TDK-TDK-CGA5L1X5R1C226MT0Y0E_C329953.html
footprint CAP-1206 (1206 (3216M) Capacitor)
pins: 1, 2

## CGA5L1X7R0J226MT0Y0E
designator C?  Capacitance: 22uF  (hidden comment: *)
Capacitor, Ceramic (MLCC), 22uF, ±20%, 6.3V, X7R, ±20%, SMD 1206; Manufacturer: TDK; Manufacturer Part Number: CGA5L1X7R0J226MT0Y0E; Package Size: 1206; JLCPCB Basic Part: No; JLCPCB Part Number: C342630; Supplier 1: LCSC; Category: Capacitors - MLCC; Supplier Part Number 1: C342630; Tolerance: ±20%; Voltage Rating: 6.3V; Temperature Coefficient: X7R; RoHS: Yes; ComponentLink1Description: Datasheet; ComponentLink1URL: https://wmsc.lcsc.com/wmsc/upload/file/pdf/v2/lcsc/2304140030_TDK-CGA5L1X7R0J226MT0Y0E_C342630.pdf; ComponentLink2Description: JLCPCB Part URL; ComponentLink2URL: https://jlcpcb.com/partdetail/C342630; ComponentLink3Description: LCSC Part URL; ComponentLink3URL: https://lcsc.com/product-detail/Multilayer-Ceramic-Capacitors-MLCC---SMD-SMT_TDK-TDK-CGA5L1X7R0J226MT0Y0E_C342630.html
footprint CAP-1206 (1206 (3216M) Capacitor)
pins: 1, 2

## CGA5L1X7R1C106KT0Y0N
designator C?  Capacitance: 10uF  (hidden comment: *)
Capacitor, Ceramic (MLCC), 10uF, ±10%, 16V, X7R, ±10%, SMD 1206; Manufacturer: TDK; Manufacturer Part Number: CGA5L1X7R1C106KT0Y0N; Package Size: 1206; JLCPCB Basic Part: No; JLCPCB Part Number: C338070; Supplier 1: LCSC; Category: Capacitors - MLCC; Supplier Part Number 1: C338070; Tolerance: ±10%; Voltage Rating: 16V; Temperature Coefficient: X7R; RoHS: Yes; ComponentLink1Description: Datasheet; ComponentLink1URL: https://wmsc.lcsc.com/wmsc/upload/file/pdf/v2/lcsc/2304140030_TDK-CGA5L1X7R1C106KT0Y0N_C338070.pdf; ComponentLink2Description: JLCPCB Part URL; ComponentLink2URL: https://jlcpcb.com/partdetail/C338070; ComponentLink3Description: LCSC Part URL; ComponentLink3URL: https://lcsc.com/product-detail/Multilayer-Ceramic-Capacitors-MLCC---SMD-SMT_TDK-TDK-CGA5L1X7R1C106KT0Y0N_C338070.html
footprint CAP-1206 (1206 (3216M) Capacitor)
pins: 1, 2

## CGA5L1X7R1C106MT0Y0N
designator C?  Capacitance: 10uF  (hidden comment: *)
Capacitor, Ceramic (MLCC), 10uF, ±20%, 16V, X7R, ±20%, SMD 1206; Manufacturer: TDK; Manufacturer Part Number: CGA5L1X7R1C106MT0Y0N; Package Size: 1206; JLCPCB Basic Part: No; JLCPCB Part Number: C445702; Supplier 1: LCSC; Category: Capacitors - MLCC; Supplier Part Number 1: C445702; Tolerance: ±20%; Voltage Rating: 16V; Temperature Coefficient: X7R; RoHS: Yes; ComponentLink1Description: Datasheet; ComponentLink1URL: https://wmsc.lcsc.com/wmsc/upload/file/pdf/v2/lcsc/2304140030_TDK-CGA5L1X7R1C106MT0Y0N_C445702.pdf; ComponentLink2Description: JLCPCB Part URL; ComponentLink2URL: https://jlcpcb.com/partdetail/C445702; ComponentLink3Description: LCSC Part URL; ComponentLink3URL: https://lcsc.com/product-detail/Multilayer-Ceramic-Capacitors-MLCC---SMD-SMT_TDK-TDK-CGA5L1X7R1C106MT0Y0N_C445702.html
footprint CAP-1206 (1206 (3216M) Capacitor)
pins: 1, 2

## CGA5L1X7R1C335KT0Y0N
designator C?  Capacitance: 3.3uF  (hidden comment: *)
Capacitor, Ceramic (MLCC), 3.3uF, ±10%, 16V, X7R, ±10%, SMD 1206; Manufacturer: TDK; Manufacturer Part Number: CGA5L1X7R1C335KT0Y0N; Package Size: 1206; JLCPCB Basic Part: No; JLCPCB Part Number: C338046; Supplier 1: LCSC; Category: Capacitors - MLCC; Supplier Part Number 1: C338046; Tolerance: ±10%; Voltage Rating: 16V; Temperature Coefficient: X7R; RoHS: Yes; ComponentLink1Description: Datasheet; ComponentLink1URL: https://wmsc.lcsc.com/wmsc/upload/file/pdf/v2/lcsc/2304140030_TDK-CGA5L1X7R1C335KT0Y0N_C338046.pdf; ComponentLink2Description: JLCPCB Part URL; ComponentLink2URL: https://jlcpcb.com/partdetail/C338046; ComponentLink3Description: LCSC Part URL; ComponentLink3URL: https://lcsc.com/product-detail/Multilayer-Ceramic-Capacitors-MLCC---SMD-SMT_TDK-TDK-CGA5L1X7R1C335KT0Y0N_C338046.html
footprint CAP-1206 (1206 (3216M) Capacitor)
pins: 1, 2

## CGA5L1X7R1E106KT0Y0E
designator C?  Capacitance: 10uF  (hidden comment: *)
Capacitor, Ceramic (MLCC), 10uF, ±10%, 25V, X7R, ±10%, SMD 1206; Manufacturer: TDK; Manufacturer Part Number: CGA5L1X7R1E106KT0Y0E; Package Size: 1206; JLCPCB Basic Part: No; JLCPCB Part Number: C76715; Supplier 1: LCSC; Category: Capacitors - MLCC; Supplier Part Number 1: C76715; Tolerance: ±10%; Voltage Rating: 25V; Temperature Coefficient: X7R; RoHS: Yes; ComponentLink1Description: Datasheet; ComponentLink1URL: https://wmsc.lcsc.com/wmsc/upload/file/pdf/v2/lcsc/2304140030_TDK-CGA5L1X7R1E106KT0Y0E_C76715.pdf; ComponentLink2Description: JLCPCB Part URL; ComponentLink2URL: https://jlcpcb.com/partdetail/C76715; ComponentLink3Description: LCSC Part URL; ComponentLink3URL: https://lcsc.com/product-detail/Multilayer-Ceramic-Capacitors-MLCC---SMD-SMT_TDK-TDK-CGA5L1X7R1E106KT0Y0E_C76715.html
footprint CAP-1206 (1206 (3216M) Capacitor)
pins: 1, 2

## CGA5L1X7R1E475KTJY0N
designator C?  Capacitance: 4.7uF  (hidden comment: *)
Capacitor, Ceramic (MLCC), 4.7uF, ±10%, 25V, X7R, ±10%, SMD 1206; Manufacturer: TDK; Manufacturer Part Number: CGA5L1X7R1E475KTJY0N; Package Size: 1206; JLCPCB Basic Part: No; JLCPCB Part Number: C329964; Supplier 1: LCSC; Category: Capacitors - MLCC; Supplier Part Number 1: C329964; Tolerance: ±10%; Voltage Rating: 25V; Temperature Coefficient: X7R; RoHS: Yes; ComponentLink1Description: Datasheet; ComponentLink1URL: https://wmsc.lcsc.com/wmsc/upload/file/pdf/v2/lcsc/2304140030_TDK-CGA5L1X7R1E475KTJY0N_C329964.pdf; ComponentLink2Description: JLCPCB Part URL; ComponentLink2URL: https://jlcpcb.com/partdetail/C329964; ComponentLink3Description: LCSC Part URL; ComponentLink3URL: https://lcsc.com/product-detail/Multilayer-Ceramic-Capacitors-MLCC---SMD-SMT_TDK-TDK-CGA5L1X7R1E475KTJY0N_C329964.html
footprint CAP-1206 (1206 (3216M) Capacitor)
pins: 1, 2

## CGA5L1X7R1E685K160AC
designator C?  Capacitance: 6.8uF  (hidden comment: *)
Capacitor, Ceramic (MLCC), 6.8uF, ±10%, 25V, X7R, ±10%, SMD 1206; Manufacturer: TDK; Manufacturer Part Number: CGA5L1X7R1E685K160AC; Package Size: 1206; JLCPCB Basic Part: No; JLCPCB Part Number: C2171029; Supplier 1: LCSC; Category: Capacitors - MLCC; Supplier Part Number 1: C2171029; Tolerance: ±10%; Voltage Rating: 25V; Temperature Coefficient: X7R; RoHS: Yes; ComponentLink1Description: Datasheet; ComponentLink1URL: https://wmsc.lcsc.com/wmsc/upload/file/pdf/v2/lcsc/2304140030_TDK-CGA5L1X7R1E685K160AC_C2171029.pdf; ComponentLink2Description: JLCPCB Part URL; ComponentLink2URL: https://jlcpcb.com/partdetail/C2171029; ComponentLink3Description: LCSC Part URL; ComponentLink3URL: https://lcsc.com/product-detail/Multilayer-Ceramic-Capacitors-MLCC---SMD-SMT_TDK-TDK-CGA5L1X7R1E685K160AC_C2171029.html
footprint CAP-1206 (1206 (3216M) Capacitor)
pins: 1, 2

## CGA5L1X7R1H106KT0Y0N
designator C?  Capacitance: 10uF  (hidden comment: *)
Capacitor, Ceramic (MLCC), 10uF, ±10%, 50V, X7R, ±10%, SMD 1206; Manufacturer: TDK; Manufacturer Part Number: CGA5L1X7R1H106KT0Y0N; Package Size: 1206; JLCPCB Basic Part: No; JLCPCB Part Number: C531431; Supplier 1: LCSC; Category: Capacitors - MLCC; Supplier Part Number 1: C531431; Tolerance: ±10%; Voltage Rating: 50V; Temperature Coefficient: X7R; RoHS: Yes; ComponentLink1Description: Datasheet; ComponentLink1URL: https://wmsc.lcsc.com/wmsc/upload/file/pdf/v2/lcsc/2304140030_TDK-CGA5L1X7R1H106KT0Y0N_C531431.pdf; ComponentLink2Description: JLCPCB Part URL; ComponentLink2URL: https://jlcpcb.com/partdetail/C531431; ComponentLink3Description: LCSC Part URL; ComponentLink3URL: https://lcsc.com/product-detail/Multilayer-Ceramic-Capacitors-MLCC---SMD-SMT_TDK-TDK-CGA5L1X7R1H106KT0Y0N_C531431.html
footprint CAP-1206 (1206 (3216M) Capacitor)
pins: 1, 2

## CGA5L1X7R1H475KT0Y0N
designator C?  Capacitance: 4.7uF  (hidden comment: *)
Capacitor, Ceramic (MLCC), 4.7uF, ±10%, 50V, X7R, ±10%, SMD 1206; Manufacturer: TDK; Manufacturer Part Number: CGA5L1X7R1H475KT0Y0N; Package Size: 1206; JLCPCB Basic Part: No; JLCPCB Part Number: C392864; Supplier 1: LCSC; Category: Capacitors - MLCC; Supplier Part Number 1: C392864; Tolerance: ±10%; Voltage Rating: 50V; Temperature Coefficient: X7R; RoHS: Yes; ComponentLink1Description: Datasheet; ComponentLink1URL: https://wmsc.lcsc.com/wmsc/upload/file/pdf/v2/lcsc/1912111437_TDK-CGA5L1X7R1H475KT0Y0N_C392864.pdf; ComponentLink2Description: JLCPCB Part URL; ComponentLink2URL: https://jlcpcb.com/partdetail/C392864; ComponentLink3Description: LCSC Part URL; ComponentLink3URL: https://lcsc.com/product-detail/Multilayer-Ceramic-Capacitors-MLCC---SMD-SMT_TDK-TDK-CGA5L1X7R1H475KT0Y0N_C392864.html
footprint CAP-1206 (1206 (3216M) Capacitor)
pins: 1, 2

## CGA5L1X7R1H475KT0Y0S
designator C?  Capacitance: 4.7uF  (hidden comment: *)
Capacitor, Ceramic (MLCC), 4.7uF, ±10%, 50V, X7R, ±10%, SMD 1206; Manufacturer: TDK; Manufacturer Part Number: CGA5L1X7R1H475KT0Y0S; Package Size: 1206; JLCPCB Basic Part: No; JLCPCB Part Number: C412300; Supplier 1: LCSC; Category: Capacitors - MLCC; Supplier Part Number 1: C412300; Tolerance: ±10%; Voltage Rating: 50V; Temperature Coefficient: X7R; RoHS: Yes; ComponentLink1Description: Datasheet; ComponentLink1URL: https://wmsc.lcsc.com/wmsc/upload/file/pdf/v2/lcsc/2304140030_TDK-CGA5L1X7R1H475KT0Y0S_C412300.pdf; ComponentLink2Description: JLCPCB Part URL; ComponentLink2URL: https://jlcpcb.com/partdetail/C412300; ComponentLink3Description: LCSC Part URL; ComponentLink3URL: https://lcsc.com/product-detail/Multilayer-Ceramic-Capacitors-MLCC---SMD-SMT_TDK-TDK-CGA5L1X7R1H475KT0Y0S_C412300.html
footprint CAP-1206 (1206 (3216M) Capacitor)
pins: 1, 2

## CGA5L1X7R1V106KT000N
designator C?  Capacitance: 10uF  (hidden comment: *)
Capacitor, Ceramic (MLCC), 10uF, ±10%, 35V, X7R, ±10%, SMD 1206; Manufacturer: TDK; Manufacturer Part Number: CGA5L1X7R1V106KT000N; Package Size: 1206; JLCPCB Basic Part: No; JLCPCB Part Number: C342663; Supplier 1: LCSC; Category: Capacitors - MLCC; Supplier Part Number 1: C342663; Tolerance: ±10%; Voltage Rating: 35V; Temperature Coefficient: X7R; RoHS: Yes; ComponentLink1Description: Datasheet; ComponentLink1URL: https://wmsc.lcsc.com/wmsc/upload/file/pdf/v2/lcsc/2304140030_TDK-CGA5L1X7R1V106KT000N_C342663.pdf; ComponentLink2Description: JLCPCB Part URL; ComponentLink2URL: https://jlcpcb.com/partdetail/C342663; ComponentLink3Description: LCSC Part URL; ComponentLink3URL: https://lcsc.com/product-detail/Multilayer-Ceramic-Capacitors-MLCC---SMD-SMT_TDK-TDK-CGA5L1X7R1V106KT000N_C342663.html
footprint CAP-1206 (1206 (3216M) Capacitor)
pins: 1, 2

## CGA5L1X7R1V475KT0Y0E
designator C?  Capacitance: 4.7uF  (hidden comment: *)
Capacitor, Ceramic (MLCC), 4.7uF, ±10%, 35V, X7R, ±10%, SMD 1206; Manufacturer: TDK; Manufacturer Part Number: CGA5L1X7R1V475KT0Y0E; Package Size: 1206; JLCPCB Basic Part: No; JLCPCB Part Number: C76716; Supplier 1: LCSC; Category: Capacitors - MLCC; Supplier Part Number 1: C76716; Tolerance: ±10%; Voltage Rating: 35V; Temperature Coefficient: X7R; RoHS: Yes; ComponentLink1Description: Datasheet; ComponentLink1URL: https://wmsc.lcsc.com/wmsc/upload/file/pdf/v2/lcsc/2304140030_TDK-CGA5L1X7R1V475KT0Y0E_C76716.pdf; ComponentLink2Description: JLCPCB Part URL; ComponentLink2URL: https://jlcpcb.com/partdetail/C76716; ComponentLink3Description: LCSC Part URL; ComponentLink3URL: https://lcsc.com/product-detail/Multilayer-Ceramic-Capacitors-MLCC---SMD-SMT_TDK-TDK-CGA5L1X7R1V475KT0Y0E_C76716.html
footprint CAP-1206 (1206 (3216M) Capacitor)
pins: 1, 2

## CGA5L1X7S1A226MT0Y0N
designator C?  Capacitance: 22uF  (hidden comment: *)
Capacitor, Ceramic (MLCC), 22uF, ±20%, 10V, X7S, ±20%, SMD 1206; Manufacturer: TDK; Manufacturer Part Number: CGA5L1X7S1A226MT0Y0N; Package Size: 1206; JLCPCB Basic Part: No; JLCPCB Part Number: C694515; Supplier 1: LCSC; Category: Capacitors - MLCC; Supplier Part Number 1: C694515; Tolerance: ±20%; Voltage Rating: 10V; Temperature Coefficient: X7S; RoHS: Yes; ComponentLink1Description: Datasheet; ComponentLink1URL: https://wmsc.lcsc.com/wmsc/upload/file/pdf/v2/lcsc/2208221800_TDK-CGA5L1X7S1A226MT0Y0N_C694515.pdf; ComponentLink2Description: JLCPCB Part URL; ComponentLink2URL: https://jlcpcb.com/partdetail/C694515; ComponentLink3Description: LCSC Part URL; ComponentLink3URL: https://lcsc.com/product-detail/Multilayer-Ceramic-Capacitors-MLCC---SMD-SMT_TDK-TDK-CGA5L1X7S1A226MT0Y0N_C694515.html
footprint CAP-1206 (1206 (3216M) Capacitor)
pins: 1, 2

## CGA5L2C0G1H104JT0Y0N
designator C?  Capacitance: 100nF  (hidden comment: *)
Capacitor, Ceramic (MLCC), 100nF, ±5%, 50V, C0G, ±5%, SMD 1206; Manufacturer: TDK; Manufacturer Part Number: CGA5L2C0G1H104JT0Y0N; Package Size: 1206; JLCPCB Basic Part: No; JLCPCB Part Number: C338082; Supplier 1: LCSC; Category: Capacitors - MLCC; Supplier Part Number 1: C338082; Tolerance: ±5%; Voltage Rating: 50V; Temperature Coefficient: C0G; RoHS: Yes; ComponentLink1Description: Datasheet; ComponentLink1URL: https://wmsc.lcsc.com/wmsc/upload/file/pdf/v2/lcsc/2304140030_TDK-CGA5L2C0G1H104JT0Y0N_C338082.pdf; ComponentLink2Description: JLCPCB Part URL; ComponentLink2URL: https://jlcpcb.com/partdetail/C338082; ComponentLink3Description: LCSC Part URL; ComponentLink3URL: https://lcsc.com/product-detail/Multilayer-Ceramic-Capacitors-MLCC---SMD-SMT_TDK-TDK-CGA5L2C0G1H104JT0Y0N_C338082.html
footprint CAP-1206 (1206 (3216M) Capacitor)
pins: 1, 2
